# Altium footprint library kalios.PcbLib: 404 footprints (part 15 of 26)
Each footprint in its own frame and in the unit in brackets; x right, y up, seen from the top. Pads: shape width x height; smd on the part's side, far side on the other; paste and mask are expansions set on the pad; w line width, h text height; cw(c..) or ccw(c..) is an arc to the next point about the centre after c.
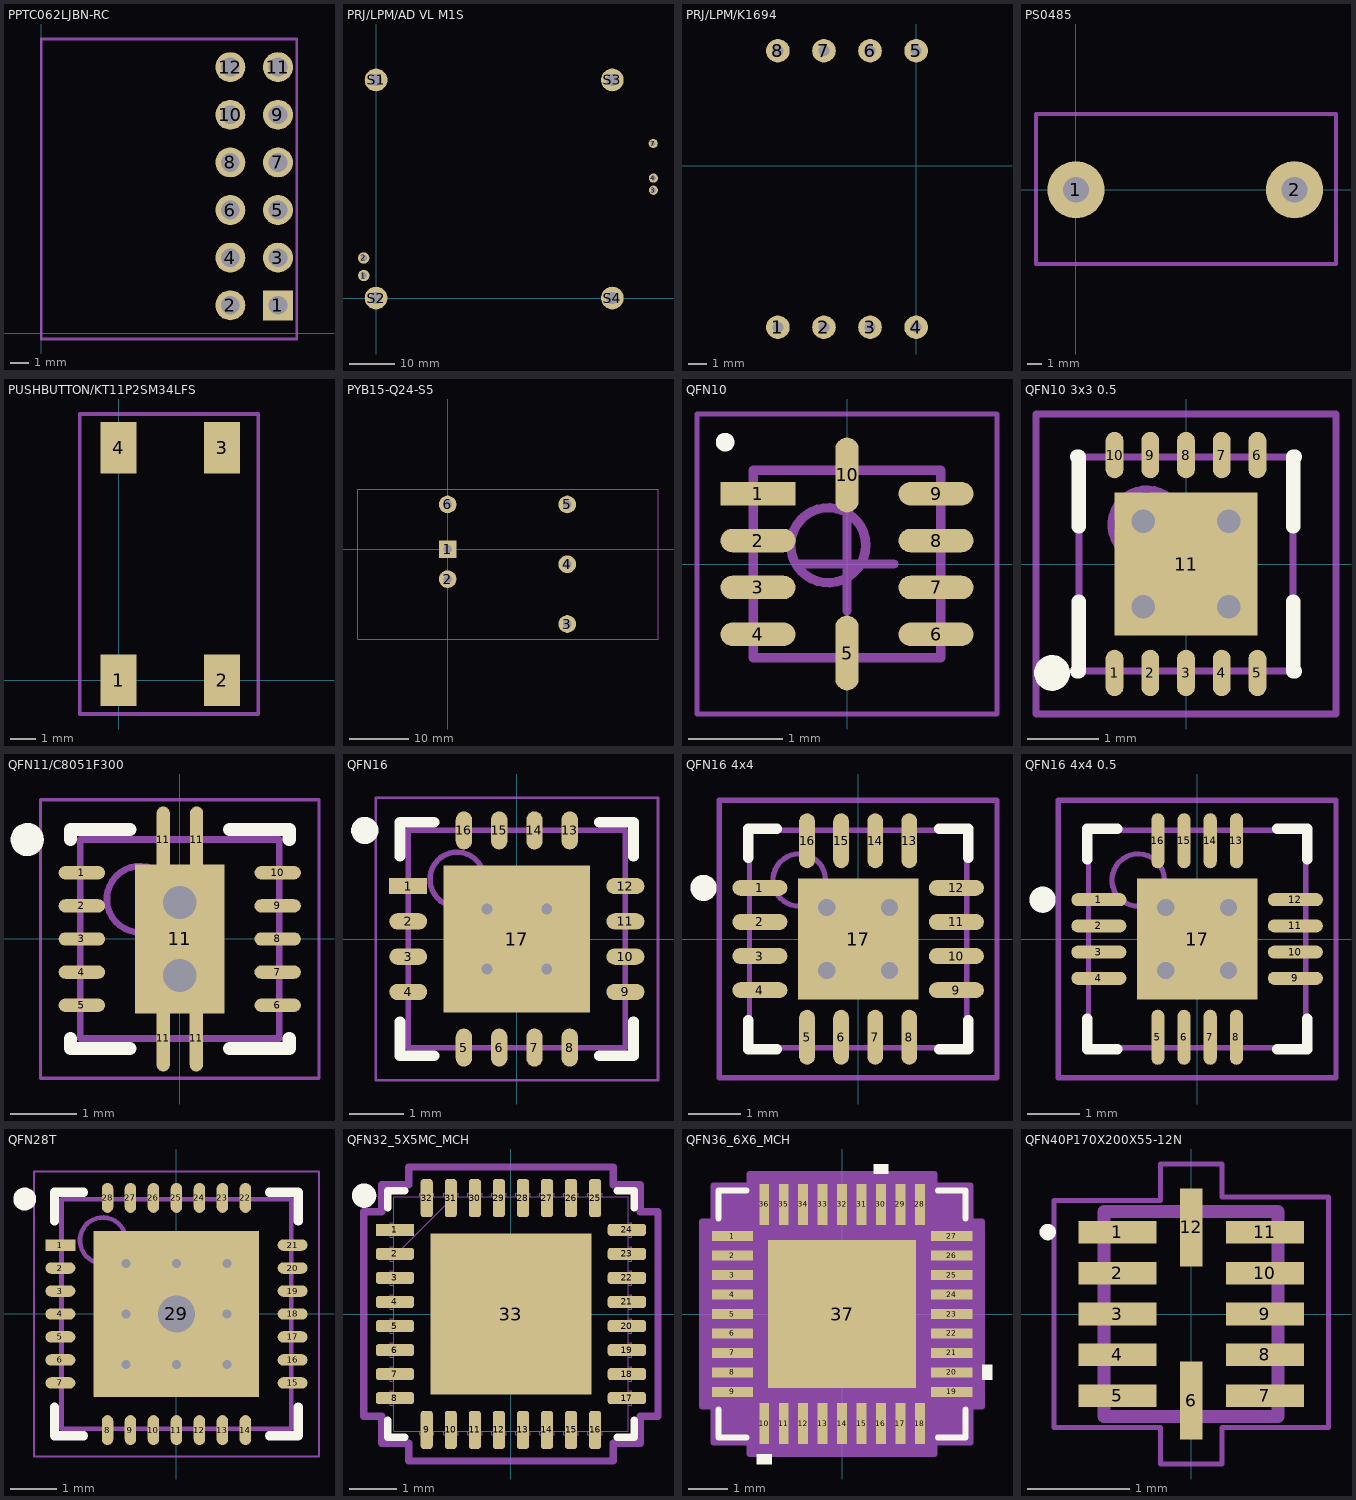
[diagram p14: the footprints below, top view; thin cyan lines are the x and y axes]

## PPTC062LJBN-RC [mm]
pads (12):
  rect 1.6x1.6 hole 1: 1(12.624,1.499)
  round 1.6 hole 1: 2(10.084,1.499) 3(12.624,4.039) 4(10.084,4.039) 5(12.624,6.579) 6(10.084,6.579) 7(12.624,9.119) 8(10.084,9.119) 9(12.624,11.659) 10(10.084,11.659) 11(12.624,14.199) 12(10.084,14.199)
Top Courtyard:
  lines w0.15: 0,-0.301 13.624,-0.301 13.624,15.699 0,15.699 0,-0.301
Top Designator:
  text ".Designator" at -0.806,7.191 h1.52
3D body "PPTC062LJBN-RC.STEP": height 5.1, standoff -2.5, extent 0,0.004 12.84,15.744

## PRJ/LPM/AD VL M1S [mm]
pads (9):
  round 2.5 hole 1.4: 1(-2.692,4.953) 2(-2.718,8.814)
  round 2 hole 1.1: 3(61.062,23.724) 4(61.062,26.391) 7(61.011,34.011)
  round 5 hole 2.7: S1(0,48) S2(0,0) S3(52,48) S4(52,0)
Top Designator:
  text ".Designator" at 20.399,23.372 h1.52
3D body "Assemblage10.STEP": height 20.14, standoff -12.5, extent -10.134,-2.87 66.166,50.63

## PRJ/LPM/K1694 [mm]
pads (8):
  round 1.3 hole 0.6: 1(-7.62,-8.89) 2(-5.08,-8.89) 3(-2.54,-8.89) 4(0,-8.89) 5(0,6.35) 6(-2.54,6.35) 7(-5.08,6.35) 8(-7.62,6.35)
Top Designator:
  text ".Designator" at -11.689,-1.778 h1.52
3D body "K1694.STEP": height 14.65, standoff -3.83, extent -18.122,-10.52 9.978,7.98

## PS0485 [mm]
pads (2):
  round 4 hole 1.8: 1(0,0) 2(15.3,0)
Top Courtyard:
  lines w0.3: -2.8,-5.2 -2.8,5.3 18.2,5.3 18.2,-5.2 -2.8,-5.2
Top Designator:
  text ".Designator" at 0.082,-0.458 h1.52

## PUSHBUTTON/KT11P2SM34LFS [mm]
pads (4):
  rect 1.4x2 smd: 1(0,0) 2(4,0) 3(4,9) 4(0,9)
Top Courtyard:
  lines w0.15: -1.5,-1.3 5.4,-1.3 5.4,10.3 -1.5,10.3 -1.5,-1.3
Top Designator:
  text ".Designator" at -5.668,3.992 h1.52
3D body "KT11P2SM.STEP": height 5.55, standoff 0.02, extent -1.19,-0.549 5.153,9.485

## PYB15-Q24-S5 [mm]
pads (6):
  rect 3x3 hole 1.5: 1(0,0)
  round 3 hole 1.5: 2(0,-5.08) 3(20.32,-12.7) 4(20.32,-2.54) 5(20.32,7.62) 6(0,7.62)
Top Courtyard:
  lines w0.15: -15.25,-15.25 35.75,-15.25 35.75,10.25 -15.25,10.25 -15.25,-15.25
Top Designator:
  text ".Designator" at 2.632,-3.008 h1.52
3D body "PYB15-Q24-S5.STEP": height 11.8, standoff -4.1, extent -15.189,-15.164 35.611,10.236

## QFN10 [mm]
height 0.75
pads (10):
  rect 0.8x0.25 smd: 1(-0.95,0.75)
  oval 0.8x0.25 smd: 2(-0.95,0.25) 3(-0.95,-0.25) 4(-0.95,-0.75) 6(0.95,-0.75) 7(0.95,-0.25) 8(0.95,0.25) 9(0.95,0.75)
  oval 0.25x0.8 smd: 5(0,-0.95) 10(0,0.95)
Top Overlay:
  circle w0.1: c-1.3,1.3 r0.05
Top 3D Body:
  circle w0.1: c-0.2,0.2 r0.4
  lines w0.1: -1,-1 -1,1 1,1 1,-1 -1,-1
Top Courtyard:
  lines w0.05: -1.6,-1.6 -1.6,1.6 1.6,1.6 1.6,-1.6 -1.6,-1.6
  lines w0.1: -0.5,0 0.5,0 ; 0,-0.5 0,0.5
Top Designator:
  text ".Designator" at -7.618,-0.508 h1.52
3D body "QFN10.STEP": height 0.75, standoff -0.01, extent -1.01,-1.01 1.01,1.01

## QFN10 3x3 0.5 [mm] "QFN, 10-Leads, Body 3.0x3.0mm (max), Pitch 0.50mm, IPC Medium Density"
height 0.9
pads (11):
  oval 0.25x0.65 smd: 1(-1,-1.525) 2(-0.5,-1.525) 3(0,-1.525) 4(0.5,-1.525) 5(1,-1.525) 6(1,1.525) 7(0.5,1.525) 8(0,1.525) 9(-0.5,1.525) 10(-1,1.525)
  rect 2x2 smd: 11(0,0)
via 0.6,-0.6 diameter 0.66 hole 0.33
via -0.6,-0.6 diameter 0.66 hole 0.33
via 0.6,0.6 diameter 0.66 hole 0.33
via -0.6,0.6 diameter 0.66 hole 0.33
Top Overlay:
  circle w0.25: c-1.875,-1.525 r0.125
  lines w0.2: -1.525,-1.5 -1.5,-1.5 -1.5,-0.525 ; -1.525,1.5 -1.5,1.5 -1.5,0.525 ; 1.5,-0.525 1.5,-1.5 1.525,-1.5 ; 1.5,0.525 1.5,1.5 1.525,1.5
Top 3D Body:
  circle w0.1: c-0.55,0.55 r0.5
  lines w0.1: -1.5,-1.5 1.5,-1.5 1.5,1.5 -1.5,1.5 -1.5,-1.5
Top Courtyard:
  lines w0.1: -0.5,0 0.5,0 ; 0,-0.5 0,0.5 ; -2.1,-2.1 2.1,-2.1 2.1,2.1 -2.1,2.1 -2.1,-2.1
Top Designator:
  text ".Designator" at -7.618,-0.508 h1.52
3D body: height 0.9, standoff 0.01, extent -1.5,-1.5 1.5,1.5

## QFN11/C8051F300 [mm]
height 0.9
pads (15):
  oval 0.7x0.2 smd: 1(-1.477,1) 2(-1.477,0.5) 3(-1.477,0) 4(-1.477,-0.5) 5(-1.477,-1) 6(1.477,-1) 7(1.477,-0.5) 8(1.477,0) 9(1.477,0.5) 10(1.477,1)
  oval 0.2x1 smd: 11(-0.25,-1.5) 11(-0.25,1.5) 11(0.25,-1.5) 11(0.254,1.5)
  rect 1.35x2.25 smd: 11(0,0)
via 0,-0.55 diameter 0.6 hole 0.5
via 0,0.55 diameter 0.6 hole 0.5
Top Overlay:
  circle w0.25: c-2.3,1.5 r0.125
  lines w0.2: -1.65,-1.5 -1.65,-1.65 -0.75,-1.65 ; -1.65,1.5 -1.65,1.65 -0.75,1.65 ; 0.75,-1.65 1.65,-1.65 1.65,-1.5 ; 0.75,1.65 1.65,1.65 1.65,1.5
Top 3D Body:
  circle w0.1: c-0.6,0.6 r0.5
  lines w0.1: -1.5,-1.5 1.5,-1.5 1.5,1.5 -1.5,1.5 -1.5,-1.5
Top Courtyard:
  lines w0.05: -2.1,-2.1 2.1,-2.1 2.1,2.1 -2.1,2.1 -2.1,-2.1
  lines w0.1: -0.5,0 0.5,0 ; 0,-0.5 0,0.5
Top Designator:
  text ".Designator" at -7.83,-0.508 h1.52
3D body "qfn11.STEP": height 0.92, standoff -0.01, extent -1.492,-1.511 1.511,1.491

## QFN16 [mm]
height 1
pads (17):
  rect 0.7x0.3 smd: 1(-2,0.975)
  oval 0.7x0.3 smd: 2(-2,0.325) 3(-2,-0.325) 4(-2,-0.975) 9(2,-0.975) 10(2,-0.325) 11(2,0.325) 12(2,0.975)
  oval 0.3x0.7 smd: 5(-0.975,-2) 6(-0.325,-2) 7(0.325,-2) 8(0.975,-2) 13(0.975,2) 14(0.325,2) 15(-0.325,2) 16(-0.975,2)
  rect 2.7x2.7 smd: 17(0,0)
via 0.55,-0.55 diameter 0.5 hole 0.2
via -0.55,-0.55 diameter 0.5 hole 0.2
via 0.55,0.55 diameter 0.5 hole 0.2
via -0.55,0.55 diameter 0.5 hole 0.2
Top Overlay:
  circle w0.25: c-2.8,2 r0.125
  lines w0.2: -2.15,-1.525 -2.15,-2.15 -1.525,-2.15 ; -2.15,1.525 -2.15,2.15 -1.525,2.15 ; 1.525,-2.15 2.15,-2.15 2.15,-1.525 ; 1.525,2.15 2.15,2.15 2.15,1.525
Top 3D Body:
  circle w0.1: c-1.1,1.1 r0.5
  lines w0.1: -2,-2 2,-2 2,2 -2,2 -2,-2
Top Courtyard:
  lines w0.05: -2.6,-2.6 2.6,-2.6 2.6,2.6 -2.6,2.6 -2.6,-2.6
  lines w0.1: -0.5,0 0.5,0 ; 0,-0.5 0,0.5
Top Designator:
  text ".Designator" at -7.83,-0.508 h1.52
3D body: height 1, standoff 0.02, extent -2,-2 2,2

## QFN16 4x4 [mm] "QFN, 16-Leads, Body 4.2x4.2mm (max), Pitch 0.65mm, IPC Medium Density"
height 0.8
pads (17):
  oval 1.05x0.3 smd: 1(-1.875,0.975) 2(-1.875,0.325) 3(-1.875,-0.325) 4(-1.875,-0.975) 9(1.875,-0.975) 10(1.875,-0.325) 11(1.875,0.325) 12(1.875,0.975)
  oval 0.3x1.05 smd: 5(-0.975,-1.875) 6(-0.325,-1.875) 7(0.325,-1.875) 8(0.975,-1.875) 13(0.975,1.875) 14(0.325,1.875) 15(-0.325,1.875) 16(-0.975,1.875)
  rect 2.3x2.3 smd: 17(0,0)
via 0.6,-0.6 diameter 0.66 hole 0.33
via -0.6,-0.6 diameter 0.66 hole 0.33
via 0.6,0.6 diameter 0.66 hole 0.33
via -0.6,0.6 diameter 0.66 hole 0.33
Top Overlay:
  circle w0.25: c-2.95,0.975 r0.125
  lines w0.2: -2.1,-1.55 -2.1,-2.1 -1.55,-2.1 ; -2.1,1.55 -2.1,2.1 -1.55,2.1 ; 1.55,-2.1 2.1,-2.1 2.1,-1.55 ; 1.55,2.1 2.1,2.1 2.1,1.55
Top 3D Body:
  circle w0.1: c-1.125,1.125 r0.5
  lines w0.1: -2.075,-2.075 2.075,-2.075 2.075,2.075 -2.075,2.075 -2.075,-2.075
Top Courtyard:
  lines w0.1: -0.5,0 0.5,0 ; 0,-0.5 0,0.5 ; -2.65,-2.65 2.65,-2.65 2.65,2.65 -2.65,2.65 -2.65,-2.65
Top Designator:
  text ".Designator" at -7.868,-0.508 h1.52
3D body "qfn16-4x4.STEP": height 0.92, standoff 0, extent -2,-2 2,2

## QFN16 4x4 0.5 [mm] "QFN, 16-Leads, Body 4.2x4.2mm (max), Pitch 0.50mm, IPC Medium Density"
height 0.8
pads (17):
  oval 1.05x0.25 smd: 1(-1.875,0.75) 2(-1.875,0.25) 3(-1.875,-0.25) 4(-1.875,-0.75) 9(1.875,-0.75) 10(1.875,-0.25) 11(1.875,0.25) 12(1.875,0.75)
  oval 0.25x1.05 smd: 5(-0.75,-1.875) 6(-0.25,-1.875) 7(0.25,-1.875) 8(0.75,-1.875) 13(0.75,1.875) 14(0.25,1.875) 15(-0.25,1.875) 16(-0.75,1.875)
  rect 2.3x2.3 smd: 17(0,0)
via 0.6,-0.6 diameter 0.66 hole 0.33
via -0.6,-0.6 diameter 0.66 hole 0.33
via 0.6,0.6 diameter 0.66 hole 0.33
via -0.6,0.6 diameter 0.66 hole 0.33
Top Overlay:
  circle w0.25: c-2.95,0.75 r0.125
  lines w0.2: -2.1,-1.525 -2.1,-2.1 -1.525,-2.1 ; -2.1,1.525 -2.1,2.1 -1.525,2.1 ; 1.525,-2.1 2.1,-2.1 2.1,-1.525 ; 1.525,2.1 2.1,2.1 2.1,1.525
Top 3D Body:
  circle w0.1: c-1.125,1.125 r0.5
  lines w0.1: -2.075,-2.075 2.075,-2.075 2.075,2.075 -2.075,2.075 -2.075,-2.075
Top Courtyard:
  lines w0.1: -0.5,0 0.5,0 ; 0,-0.5 0,0.5 ; -2.65,-2.65 2.65,-2.65 2.65,2.65 -2.65,2.65 -2.65,-2.65
Top Designator:
  text ".Designator" at -7.868,-0.508 h1.52
3D body "qfn16-4x4.STEP": height 0.92, standoff 0, extent -2,-2 2,2

## QFN28T [mm]
height 0.6
pads (29):
  rect 0.65x0.25 smd: 1(-2.525,1.5)
  oval 0.65x0.25 smd: 2(-2.525,1) 3(-2.525,0.5) 4(-2.525,0) 5(-2.525,-0.5) 6(-2.525,-1) 7(-2.525,-1.5) 15(2.525,-1.5) 16(2.525,-1) 17(2.525,-0.5) 18(2.525,0) 19(2.525,0.5) 20(2.525,1) 21(2.525,1.5)
  oval 0.25x0.65 smd: 8(-1.5,-2.525) 9(-1,-2.525) 10(-0.5,-2.525) 11(0,-2.525) 12(0.5,-2.525) 13(1,-2.525) 14(1.5,-2.525) 22(1.5,2.525) 23(1,2.525) 24(0.5,2.525) 25(0,2.525) 26(-0.5,2.525) 27(-1,2.525) 28(-1.5,2.525)
  rect 3.6x3.6 smd: 29(0,0)
via 1.1,-1.1 diameter 0.5 hole 0.2
via 0,-1.1 diameter 0.5 hole 0.2
via -1.1,-1.1 diameter 0.5 hole 0.2
via 1.1,0 diameter 0.5 hole 0.2
via 0,0 diameter 1 hole 0.8
via -1.1,0 diameter 0.5 hole 0.2
via 1.1,1.1 diameter 0.5 hole 0.2
via 0,1.1 diameter 0.5 hole 0.2
via -1.1,1.1 diameter 0.5 hole 0.2
Top Overlay:
  circle w0.25: c-3.3,2.5 r0.125
  lines w0.2: -2.65,-2.025 -2.65,-2.65 -2.025,-2.65 ; -2.65,2.025 -2.65,2.65 -2.025,2.65 ; 2.025,-2.65 2.65,-2.65 2.65,-2.025 ; 2.025,2.65 2.65,2.65 2.65,2.025
Top 3D Body:
  circle w0.1: c-1.6,1.6 r0.5
  lines w0.1: -2.5,-2.5 2.5,-2.5 2.5,2.5 -2.5,2.5 -2.5,-2.5
Top Courtyard:
  lines w0.05: -3.1,-3.1 3.1,-3.1 3.1,3.1 -3.1,3.1 -3.1,-3.1
  lines w0.1: -0.5,0 0.5,0 ; 0,-0.5 0,0.5
Top Designator:
  text ".Designator" at -7.83,-0.508 h1.52
3D body "QFN28-0_5.STEP": height 1, standoff 0, extent -2.5,-2.5 2.5,2.5

## QFN32_5X5MC_MCH [mil]
pads (33):
  rect 31.81x10.03 smd paste+0 mask+0: 1(-96.41,70)
  rrect50% 31.81x10.03 smd paste+0 mask+0: 2(-96.41,50) 3(-96.41,30) 4(-96.41,10) 5(-96.41,-10) 6(-96.41,-30) 7(-96.41,-50) 8(-96.41,-70) 17(96.41,-70) 18(96.41,-50) 19(96.41,-30) 20(96.41,-10) 21(96.41,10) 22(96.41,30) 23(96.41,50) 24(96.41,70)
  rrect50% 10.03x31.81 smd paste+0 mask+0: 9(-70,-96.41) 10(-50,-96.41) 11(-30,-96.41) 12(-10,-96.41) 13(10,-96.41) 14(30,-96.41) 15(50,-96.41) 16(70,-96.41) 25(70,96.41) 26(50,96.41) 27(30,96.41) 28(10,96.41) 29(-10,96.41) 30(-30,96.41) 31(-50,96.41) 32(-70,96.41)
  rect 133.86x133.86 smd paste-66.5 mask+0: 33(0,0)
Top Overlay:
  circle w10: c-122.05,98.43 r5.12
  lines w6: -102.5,-88.12 -102.5,-102.5 -88.12,-102.5 ; -102.5,88.12 -102.5,102.5 -88.12,102.5 ; 88.12,-102.5 102.5,-102.5 102.5,-88.12 ; 88.12,102.5 102.5,102.5 102.5,88.12
Top Paste:
  region: -3.94,63.06 -63.06,63.06 -63.06,3.94 -3.94,3.94
  region: -3.94,-3.94 -63.06,-3.94 -63.06,-63.06 -3.94,-63.06
  region: 63.06,63.06 3.94,63.06 3.94,3.94 63.06,3.94
  region: 63.06,-3.94 3.94,-3.94 3.94,-63.06 63.06,-63.06
Top 3D Body:
  lines w1: -97.5,47.5 -47.5,97.5 ; -100.5,-76 -100.5,-64 -97.5,-64 -97.5,-76 -100.5,-76 ; -100.5,-56 -100.5,-44 -97.5,-44 -97.5,-56 -100.5,-56 ; -100.5,-36 -100.5,-24 -97.5,-24 -97.5,-36 -100.5,-36 ; -100.5,-16 -100.5,-4 -97.5,-4 -97.5,-16 -100.5,-16 ; -100.5,4 -100.5,16 -97.5,16 -97.5,4 -100.5,4 ; -100.5,24 -100.5,36 -97.5,36 -97.5,24 -100.5,24 ; -100.5,44 -100.5,56 -97.5,56 -97.5,44 -100.5,44 ; -100.5,64 -100.5,76 -97.5,76 -97.5,64 -100.5,64 ; -97.5,-97.5 97.5,-97.5 97.5,97.5 -97.5,97.5 -97.5,-97.5 ; -76,-100.5 -76,-97.5 -64,-97.5 -64,-100.5 -76,-100.5 ; -76,97.5 -64,97.5 -64,100.5 -76,100.5 -76,97.5 ; -56,-100.5 -56,-97.5 -44,-97.5 -44,-100.5 -56,-100.5 ; -56,97.5 -44,97.5 -44,100.5 -56,100.5 -56,97.5 ; -36,-100.5 -36,-97.5 -24,-97.5 -24,-100.5 -36,-100.5 ; -36,97.5 -24,97.5 -24,100.5 -36,100.5 -36,97.5 ; -16,-100.5 -16,-97.5 -4,-97.5 -4,-100.5 -16,-100.5 ; -16,97.5 -4,97.5 -4,100.5 -16,100.5 -16,97.5 ; 4,-100.5 4,-97.5 16,-97.5 16,-100.5 4,-100.5 ; 4,97.5 16,97.5 16,100.5 4,100.5 4,97.5 ; 24,-100.5 24,-97.5 36,-97.5 36,-100.5 24,-100.5 ; 24,97.5 36,97.5 36,100.5 24,100.5 24,97.5 ; 44,-100.5 44,-97.5 56,-97.5 56,-100.5 44,-100.5 ; 44,97.5 56,97.5 56,100.5 44,100.5 44,97.5 ; 64,-100.5 64,-97.5 76,-97.5 76,-100.5 64,-100.5 ; 64,97.5 76,97.5 76,100.5 64,100.5 64,97.5 ; 97.5,-76 97.5,-64 100.5,-64 100.5,-76 97.5,-76 ; 97.5,-56 97.5,-44 100.5,-44 100.5,-56 97.5,-56 ; 97.5,-36 97.5,-24 100.5,-24 100.5,-36 97.5,-36 ; 97.5,-16 97.5,-4 100.5,-4 100.5,-16 97.5,-16 ; 97.5,4 97.5,16 100.5,16 100.5,4 97.5,4 ; 97.5,24 97.5,36 100.5,36 100.5,24 97.5,24 ; 97.5,44 97.5,56 100.5,56 100.5,44 97.5,44 ; 97.5,64 97.5,76 100.5,76 100.5,64 97.5,64
  text "*" at -93,55 h50
Top Courtyard:
  lines w6: -122.31,-85.02 -107.5,-85.02 -107.5,-107.5 -85.02,-107.5 -85.02,-122.31 85.02,-122.31 85.02,-107.5 107.5,-107.5 107.5,-85.02 122.31,-85.02 122.31,85.02 107.5,85.02 107.5,107.5 85.02,107.5 85.02,122.31 -85.02,122.31 -85.02,107.5 -107.5,107.5 -107.5,85.02 -122.31,85.02 -122.31,-85.02
Top Designator:
  text ".Designator" at -114.57,-7.87 h23.62
3D body: height 10, standoff 0, extent 0,0 10,10
3D body "QFN32_5X5MC_MCH.step": height 65.12, standoff 0, extent -100.51,-100.51 100.51,100.52

## QFN36_6X6_MCH [mm]
pads (37):
  rect 1.062x0.255 smd paste+0 mask+0: 1(-2.817,2) 2(-2.817,1.5) 3(-2.817,1) 4(-2.817,0.5) 5(-2.817,0) 6(-2.817,-0.5) 7(-2.817,-1) 8(-2.817,-1.5) 9(-2.817,-2) 19(2.817,-2) 20(2.817,-1.5) 21(2.817,-1) 22(2.817,-0.5) 23(2.817,0) 24(2.817,0.5) 25(2.817,1) 26(2.817,1.5) 27(2.817,2)
  rect 0.255x1.062 smd paste+0 mask+0: 10(-2,-2.817) 11(-1.5,-2.817) 12(-1,-2.817) 13(-0.5,-2.817) 14(0,-2.817) 15(0.5,-2.817) 16(1,-2.817) 17(1.5,-2.817) 18(2,-2.817) 28(2,2.817) 29(1.5,2.817) 30(1,2.817) 31(0.5,2.817) 32(0,2.817) 33(-0.5,2.817) 34(-1,2.817) 35(-1.5,2.817) 36(-2,2.817)
  rect 3.81x3.81 smd paste-1.892 mask+0: 37(0,0)
Top Overlay:
  region: 1.191,3.602 0.81,3.602 0.81,3.856 1.191,3.856
  region: 3.602,-1.309 3.856,-1.309 3.856,-1.69 3.602,-1.69
  region: -1.81,-3.602 -2.191,-3.602 -2.191,-3.856 -1.81,-3.856
  lines w0.152: -3.175,-2.46 -3.175,-3.175 -2.46,-3.175 ; -3.175,2.46 -3.175,3.175 -2.46,3.175 ; 2.46,-3.175 3.175,-3.175 3.175,-2.46 ; 2.46,3.175 3.175,3.175 3.175,2.46
Top Paste:
  region: 1.805,-0.735 0.735,-0.735 0.735,-1.805 1.805,-1.805
  region: 1.805,0.535 0.735,0.535 0.735,-0.535 1.805,-0.535
  region: 1.805,1.805 0.735,1.805 0.735,0.735 1.805,0.735
  region: 0.535,-0.735 -0.535,-0.735 -0.535,-1.805 0.535,-1.805
  region: 0.535,0.535 -0.535,0.535 -0.535,-0.535 0.535,-0.535
  region: 0.535,1.805 -0.535,1.805 -0.535,0.735 0.535,0.735
  region: -0.735,-0.735 -1.805,-0.735 -1.805,-1.805 -0.735,-1.805
  region: -0.735,0.535 -1.805,0.535 -1.805,-0.535 -0.735,-0.535
  region: -0.735,1.805 -1.805,1.805 -1.805,0.735 -0.735,0.735
Top 3D Body:
  lines w0.025: -3.048,1.778 -1.778,3.048 ; -3.048,-3.048 -3.048,3.048 3.048,3.048 3.048,-3.048 -3.048,-3.048 ; -3.048,-2.152 -3.048,-1.848 -3.048,-2.152 ; -3.048,-1.652 -3.048,-1.348 -3.048,-1.652 ; -3.048,-1.152 -3.048,-0.848 -3.048,-1.152 ; -3.048,-0.652 -3.048,-0.348 -3.048,-0.652 ; -3.048,-0.152 -3.048,0.152 -3.048,-0.152 ; -3.048,0.348 -3.048,0.652 -3.048,0.348 ; -3.048,0.848 -3.048,1.152 -3.048,0.848 ; -3.048,1.348 -3.048,1.652 -3.048,1.348 ; -3.048,1.848 -3.048,2.152 -3.048,1.848 ; -2.152,-3.048 -1.848,-3.048 -2.152,-3.048 ; -2.152,3.048 -1.848,3.048 -2.152,3.048 ; -1.652,-3.048 -1.348,-3.048 -1.652,-3.048 ; -1.652,3.048 -1.348,3.048 -1.652,3.048 ; -1.152,-3.048 -0.848,-3.048 -1.152,-3.048 ; -1.152,3.048 -0.848,3.048 -1.152,3.048 ; -0.652,-3.048 -0.348,-3.048 -0.652,-3.048 ; -0.652,3.048 -0.348,3.048 -0.652,3.048 ; -0.152,-3.048 0.152,-3.048 -0.152,-3.048 ; -0.152,3.048 0.152,3.048 -0.152,3.048 ; 0.348,-3.048 0.652,-3.048 0.348,-3.048 ; 0.348,3.048 0.652,3.048 0.348,3.048 ; 0.848,-3.048 1.152,-3.048 0.848,-3.048 ; 0.848,3.048 1.152,3.048 0.848,3.048 ; 1.348,-3.048 1.652,-3.048 1.348,-3.048 ; 1.348,3.048 1.652,3.048 1.348,3.048 ; 1.848,-3.048 2.152,-3.048 1.848,-3.048 ; 1.848,3.048 2.152,3.048 1.848,3.048 ; 3.048,-2.152 3.048,-1.848 3.048,-2.152 ; 3.048,-1.652 3.048,-1.348 3.048,-1.652 ; 3.048,-1.152 3.048,-0.848 3.048,-1.152 ; 3.048,-0.652 3.048,-0.348 3.048,-0.652 ; 3.048,-0.152 3.048,0.152 3.048,-0.152 ; 3.048,0.348 3.048,0.652 3.048,0.348 ; 3.048,0.848 3.048,1.152 3.048,0.848 ; 3.048,1.348 3.048,1.652 3.048,1.348 ; 3.048,1.848 3.048,2.152 3.048,1.848
  text "*" at -2.603,1.615 h1.27
Top Courtyard:
  region: -2.381,-3.302 -3.302,-3.302 -3.302,-2.381 -3.602,-2.381 -3.602,2.381 -3.302,2.381 -3.302,3.302 -2.381,3.302 -2.381,3.602 2.381,3.602 2.381,3.302 3.302,3.302 3.302,2.381 3.602,2.381 3.602,-2.381 3.302,-2.381 3.302,-3.302 2.381,-3.302 2.381,-3.602 -2.381,-3.602
  lines w0.152: -3.602,-2.381 -3.602,2.381 -3.302,2.381 -3.302,3.302 -2.381,3.302 -2.381,3.602 2.381,3.602 2.381,3.302 3.302,3.302 3.302,2.381 3.602,2.381 3.602,-2.381 3.302,-2.381 3.302,-3.302 2.381,-3.302 2.381,-3.602 -2.381,-3.602 -2.381,-3.302 -3.302,-3.302 -3.302,-2.381 -3.602,-2.381
Top Designator:
  text ".Designator" at -7.529,-0.508 h1.52
3D body "SQFN36_6X6_MCH.STEP": height 0.99, standoff 0, extent -3.048,-3.048 3.048,3.048
3D body: height 0.25, standoff 0, extent 0,0 0.254,0.254

## QFN40P170X200X55-12N [mm]
pads (12):
  rect 0.762x0.22 smd: 1(-0.72,0.8) 2(-0.72,0.4) 3(-0.72,0) 4(-0.72,-0.4) 5(-0.72,-0.8) 7(0.72,-0.8) 8(0.72,-0.4) 9(0.72,0) 10(0.72,0.4) 11(0.72,0.8)
  rect 0.22x0.762 smd: 6(0,-0.845) 12(0,0.845)
Top Overlay:
  circle w0.08: c-1.4,0.8 r0.04
Top 3D Body:
  lines w0.127: -0.85,-1 -0.85,1 0.85,1 0.85,-1 -0.85,-1
Top Courtyard:
  lines w0.05: -1.34,-1.11 -0.3,-1.11 -0.3,-1.465 0.3,-1.465 0.3,-1.11 1.34,-1.11 1.34,1.143 0.3,1.143 0.3,1.465 -0.3,1.465 -0.3,1.11 -1.34,1.11 -1.34,-1.11
3D body "UQFN-12.STEP": height 0.55, standoff 0, extent -0.85,-1 0.85,1